# Altium footprint library Трансформаторы импульсные.PcbLib: 13 footprints
Each footprint in its own frame and in the unit in brackets; x right, y up, seen from the top. Pads: shape width x height; smd on the part's side, far side on the other; paste and mask are expansions set on the pad; w line width, h text height; cw(c..) or ccw(c..) is an arc to the next point about the centre after c.
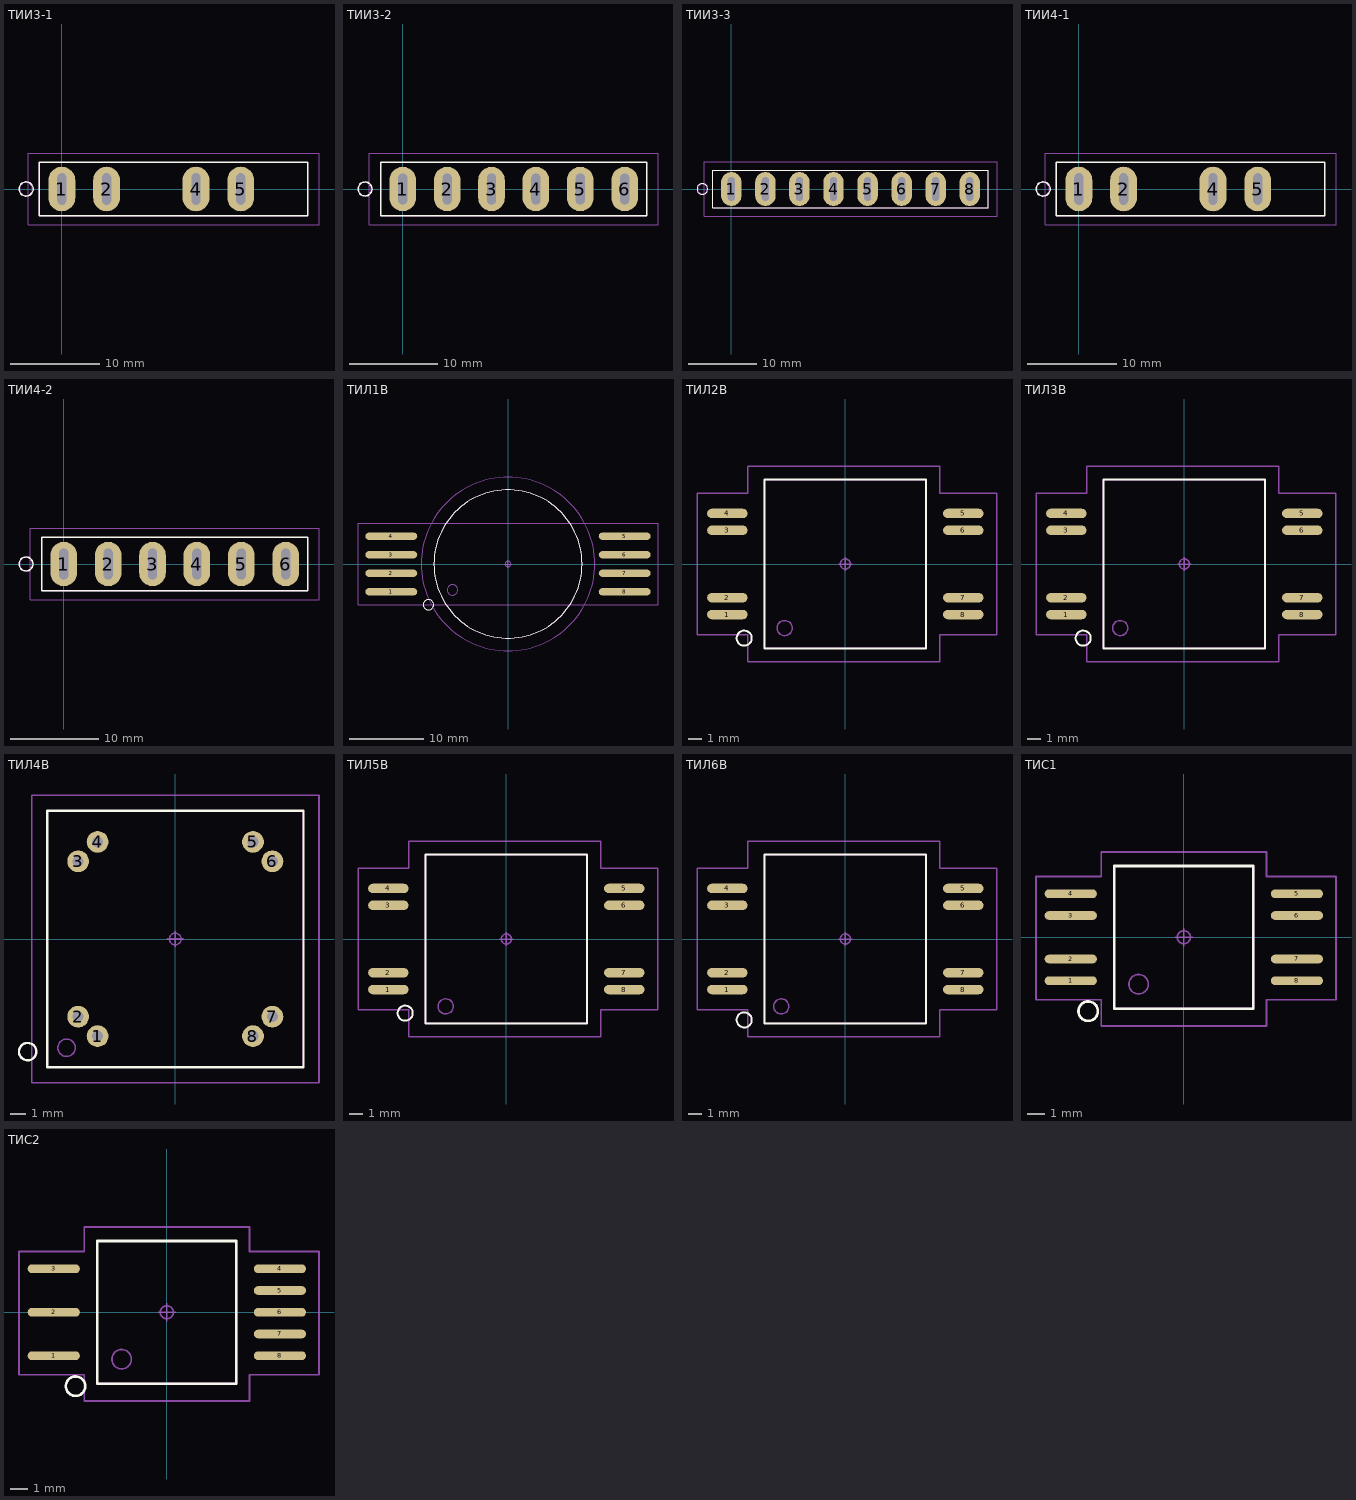
[diagram p0: the footprints below, top view; thin cyan lines are the x and y axes]

## ТИИ3-1 [mm] "30х6х20"
height 20
pads (4):
  oval 3x5 hole 3.5 slot 1 at 0 deg: 1(0,0) 2(5,0) 4(15,0) 5(20,0)
Top Overlay:
  circle w0.15: c-4,0 r0.791
  lines w0.15: -2.5,-3 -2.5,3 27.5,3 27.5,-3 -2.5,-3
Top Assembly (Mech13):
  circle w0.1: c-4,0 r0.707
  lines w0.1: -2.5,-3 -2.5,3 27.5,3 27.5,-3 -2.5,-3
Top Courtyard:
  lines w0.1: -3.75,-4 -3.75,-0.25 -3.75,4 28.75,4 28.75,-4 -3.75,-4
3D body "ТИИ3 (4 вывода).stp": height 20.05, standoff -7.15, extent -2.5,-3 27.5,3.01

## ТИИ3-2 [mm] "30х6х20"
height 20
pads (6):
  oval 3x5 hole 3.5 slot 1 at 0 deg: 1(0,0) 2(5,0) 3(10,0) 4(15,0) 5(20,0) 6(25,0)
Top Overlay:
  circle w0.15: c-4.25,0 r0.791
  lines w0.15: -2.5,-3 27.5,-3 27.5,3 -2.5,3 -2.5,-3
Top Assembly (Mech13):
  circle w0.1: c-4.25,0 r0.707
  lines w0.1: -2.5,-3 27.5,-3 27.5,3 -2.5,3 -2.5,-3
Top Courtyard:
  lines w0.1: -3.75,-4 28.75,-4 28.75,4 -3.75,4 -3.75,-0.25 -3.75,-4
3D body "ТИИ3 (6 выводов).stp": height 20.05, standoff -7.15, extent -2.5,-3 27.5,3.01

## ТИИ3-3 [mm] "40,5х5,5х20,5"
height 20.5
pads (8):
  oval 3x5 hole 3.5 slot 1 at 0 deg: 1(0,0) 2(5,0) 3(10,0) 4(15,0) 5(20,0) 6(25,0) 7(30,0) 8(35,0)
Top Overlay:
  circle w0.15: c-4.25,0 r0.791
  lines w0.15: -2.75,-2.75 -2.75,2.75 37.75,2.75 37.75,-2.75 -2.75,-2.75
Top Assembly (Mech13):
  circle w0.1: c-4.25,0 r0.707
  lines w0.1: -2.75,-2.75 -2.75,2.75 37.75,2.75 37.75,0 37.75,-2.75 -2.75,-2.75
Top Courtyard:
  lines w0.1: -4,-4 -4,0 -4,4 39,4 39,-4 -4,-4
3D body "ТИИ3 (8 выводов).stp": height 20.05, standoff -7.15, extent -2.5,-2.505 37.5,2.505

## ТИИ4-1 [mm] "30х6х20"
height 20
pads (4):
  oval 3x5 hole 3.5 slot 1 at 0 deg: 1(0,0) 2(5,0) 4(15,0) 5(20,0)
Top Overlay:
  circle w0.15: c-4,0 r0.791
  lines w0.15: -2.5,-3 -2.5,3 27.5,3 27.5,-3 -2.5,-3
Top Assembly (Mech13):
  circle w0.1: c-4,0 r0.707
  lines w0.1: -2.5,-3 -2.5,3 27.5,3 27.5,-3 -2.5,-3
Top Courtyard:
  lines w0.1: -3.75,-4 -3.75,-0.25 -3.75,4 28.75,4 28.75,-4 -3.75,-4
3D body "ТИИ4 (4 вывода).stp": height 20.05, standoff -7.15, extent -2.5,-3 27.5,3.01

## ТИИ4-2 [mm] "30х6х20"
height 20
pads (6):
  oval 3x5 hole 3.5 slot 1 at 0 deg: 1(0,0) 2(5,0) 3(10,0) 4(15,0) 5(20,0) 6(25,0)
Top Overlay:
  circle w0.15: c-4.25,0 r0.791
  lines w0.15: -2.5,-3 -2.5,3 27.5,3 27.5,-3 -2.5,-3
Top Assembly (Mech13):
  circle w0.1: c-4.25,0 r0.707
  lines w0.1: -2.5,-3 -2.5,3 27.5,3 27.5,-3 -2.5,-3
Top Courtyard:
  lines w0.1: -3.75,-4 -3.75,-0.25 -3.75,4 28.75,4 28.75,-4 -3.75,-4
3D body "ТИИ4 (6 выводов).stp": height 20.05, standoff -7.15, extent -2.5,-3 27.5,3.01

## ТИЛ1В [mm] "20х20х9, 5g"
height 9
pads (8):
  oval 7x1 smd: 1(-15.75,-3.75) 2(-15.75,-1.25) 3(-15.75,1.25) 4(-15.75,3.75) 5(15.75,3.75) 6(15.75,1.25) 7(15.75,-1.25) 8(15.75,-3.75)
Top Layer:
  lines w0.1: -15.75,-1.25 -15.25,-1.25 ; -15.75,1.25 -15.25,1.25 ; 15.25,-1.25 15.75,-1.25 ; 15.25,1.25 15.75,1.25
Top Overlay:
  circle w0.15: c0,0 r10
  circle w0.15: c-10.75,-5.5 r0.707
Top Assembly (Mech13):
  circle w0.1: c-7.5,-3.5 r0.707
  circle w0.1: c0,0 r10
Top Courtyard:
  circle w0.1: c0,0 r0.375
  circle w0.1: c0,0 r11.718
  lines w0.1: -10.75,5.5 20.25,5.5 20.25,-5.5 -20.25,-5.5 -20.25,5.5 -10.25,5.5 ; -0.5,0 0.5,0 ; 0,-0.5 0,0.5
3D body "ТИЛ1В.stp": height 9.21, standoff 0.2, extent -10,-10 10,10

## ТИЛ2В [mm] "12x12.5x6.5, 2g"
height 6.5
pads (8):
  oval 3x0.7 smd: 1(-8.75,-3.75) 2(-8.75,-2.5) 3(-8.75,2.5) 4(-8.75,3.75) 5(8.75,3.75) 6(8.75,2.5) 7(8.75,-2.5) 8(8.75,-3.75)
Top Overlay:
  circle w0.15: c-7.5,-5.5 r0.559
  lines w0.15: -6,-6.25 6,-6.25 6,6.25 -6,6.25 -6,-6.25
Top Assembly (Mech13):
  circle w0.1: c-4.5,-4.75 r0.559
  lines w0.1: -6,-6.25 6,-6.25 6,6.25 -6,6.25 -6,-6.25
Top Courtyard:
  circle w0.1: c0,0 r0.375
  lines w0.1: -0.5,0 0.5,0 ; 0,-0.5 0,0.5 ; -11,-5.25 -7.25,-5.25 -7.25,-7.25 7,-7.25 7,-5.25 11.25,-5.25 11.25,5.25 7,5.25 7,7.25 6,7.25 -7.25,7.25 -7.25,5.25 -11,5.25 -11,-5.25
3D body "ТИЛ2В.stp": height 6.71, standoff 0.2, extent -6,-6.25 6,6.25

## ТИЛ3В [mm] "12x12.5x6.5, 2g"
height 6.5
pads (8):
  oval 3x0.7 smd: 1(-8.75,-3.75) 2(-8.75,-2.5) 3(-8.75,2.5) 4(-8.75,3.75) 5(8.75,3.75) 6(8.75,2.5) 7(8.75,-2.5) 8(8.75,-3.75)
Top Overlay:
  circle w0.15: c-7.5,-5.5 r0.559
  lines w0.15: -6,-6.25 6,-6.25 6,6.25 -6,6.25 -6,-6.25
Top Assembly (Mech13):
  circle w0.1: c-4.75,-4.75 r0.559
  lines w0.1: -6,-6.25 6,-6.25 6,6.25 -6,6.25 -6,-6.25
Top Courtyard:
  circle w0.1: c0,0 r0.375
  lines w0.1: -0.5,0 0.5,0 ; 0,-0.5 0,0.5 ; -11,-5.25 -7.25,-5.25 -7.25,-7.25 7,-7.25 7,-5.25 11.25,-5.25 11.25,5.25 7,5.25 7,7.25 6,7.25 -7.25,7.25 -7.25,5.25 -11,5.25 -11,-5.25
3D body "ТИЛ3В.stp": height 6.51, standoff 0, extent -6,-6.25 6,6.25

## ТИЛ4В [mm] "16.5x16.5x9, 4g"
height 9
pads (8):
  round 1.4 hole 0.7: 1(-5,-6.25) 2(-6.25,-5) 3(-6.25,5) 4(-5,6.25) 5(5,6.25) 6(6.25,5) 7(6.25,-5) 8(5,-6.25)
Top Overlay:
  circle w0.15: c-9.5,-7.25 r0.559
  lines w0.15: -8.25,-8.25 -8.25,8.25 8.25,8.25 8.25,-8.25 -8.25,-8.25
Top Assembly (Mech13):
  circle w0.1: c-7,-7 r0.559
  lines w0.1: -8.25,-8.25 8.25,-8.25 8.25,8.25 -8.25,8.25 -8.25,-8.25
Top Courtyard:
  circle w0.1: c0,0 r0.375
  lines w0.1: -0.5,0 0.5,0 ; 0,-0.5 0,0.5 ; -9.25,-9.25 -9.25,9.25 9.25,9.25 9.25,-9.25 9,-9.25 -9.25,-9.25
3D body "ТИЛ4В.stp": height 9.01, standoff -3, extent -8.25,-8.25 8.25,8.25

## ТИЛ5В [mm] "12x12.5x6.5, 2g"
height 6.5
pads (8):
  oval 3x0.7 smd: 1(-8.75,-3.75) 2(-8.75,-2.5) 3(-8.75,2.5) 4(-8.75,3.75) 5(8.75,3.75) 6(8.75,2.5) 7(8.75,-2.5) 8(8.75,-3.75)
Top Overlay:
  circle w0.15: c-7.5,-5.5 r0.559
  lines w0.15: -6,-6.25 6,-6.25 6,6.25 -6,6.25 -6,-6.25
Top Assembly (Mech13):
  circle w0.1: c-4.5,-5 r0.559
  lines w0.1: -6,-6.25 6,-6.25 6,6.25 -6,6.25 -6,-6.25
Top Courtyard:
  circle w0.1: c0,0 r0.375
  lines w0.1: -0.5,0 0.5,0 ; 0,-0.5 0,0.5 ; -11,-5.25 -7.25,-5.25 -7.25,-7.25 7,-7.25 7,-5.25 11.25,-5.25 11.25,5.25 7,5.25 7,7.25 6,7.25 -7.25,7.25 -7.25,5.25 -11,5.25 -11,-5.25
3D body "ТИЛ5В.stp": height 6.71, standoff 0.2, extent -6,-6.25 6,6.25

## ТИЛ6В [mm] "12x12.5x6.5, 2g"
height 6.5
pads (8):
  oval 3x0.7 smd: 1(-8.75,-3.75) 2(-8.75,-2.5) 3(-8.75,2.5) 4(-8.75,3.75) 5(8.75,3.75) 6(8.75,2.5) 7(8.75,-2.5) 8(8.75,-3.75)
Top Overlay:
  circle w0.15: c-7.5,-6 r0.559
  lines w0.15: -6,-6.25 -6,6.25 6,6.25 6,-6.25 -6,-6.25
Top Assembly (Mech13):
  circle w0.1: c-4.75,-5 r0.559
  lines w0.1: -6,-6.25 -6,6.25 6,6.25 6,-6.25 -6,-6.25
Top Courtyard:
  circle w0.1: c0,0 r0.375
  lines w0.1: -0.5,0 0.5,0 ; 0,-0.5 0,0.5 ; -11,-5.25 -11,5.25 -7.25,5.25 -7.25,7.25 6,7.25 7,7.25 7,5.25 11.25,5.25 11.25,-5.25 7,-5.25 7,-7.25 -7.25,-7.25 -7.25,-5.25 -11,-5.25
3D body "ТИЛ6В.stp": height 6.71, standoff 0.2, extent -6,-6.25 6,6.25

## ТИС1 [mm] "8x8.2x5.8, 1g"
height 5.8
pads (8):
  oval 3x0.5 smd: 1(-6.5,-2.5) 2(-6.5,-1.25) 3(-6.5,1.25) 4(-6.5,2.5) 5(6.5,2.5) 6(6.5,1.25) 7(6.5,-1.25) 8(6.5,-2.5)
Top Overlay:
  circle w0.15: c-5.5,-4.25 r0.559
  lines w0.15: -4,-4.1 4,-4.1 4,4.1 -4,4.1 -4,-4.1
Top Assembly (Mech13):
  circle w0.1: c-2.6,-2.7 r0.559
  lines w0.1: -4,-4.1 4,-4.1 4,4.1 -4,4.1 -4,-4.1
Top Courtyard:
  circle w0.1: c0,0 r0.375
  lines w0.1: -0.5,0 0.5,0 ; 0,-0.5 0,0.5 ; -8.5,-3.6 -4.75,-3.6 -4.75,-5.1 4.75,-5.1 4.75,-3.6 8.75,-3.6 8.75,3.5 4.75,3.5 4.75,4.9 -4.75,4.9 -4.75,3.5 -8.5,3.5 -8.5,-3.6
3D body "ТИС1.stp": height 5.71, standoff 0.2, extent -3.75,-3.75 3.75,3.75

## ТИС2 [mm] "8x8.2x5.8, 1g"
height 5.8
pads (8):
  oval 3x0.5 smd: 1(-6.5,-2.5) 2(-6.5,0) 3(-6.5,2.5) 4(6.5,2.5) 5(6.5,1.25) 6(6.5,0) 7(6.5,-1.25) 8(6.5,-2.5)
Top Overlay:
  circle w0.15: c-5.25,-4.25 r0.559
  lines w0.15: -4,-4.1 4,-4.1 4,4.1 -4,4.1 -4,-4.1
Top Assembly (Mech13):
  circle w0.1: c-2.6,-2.7 r0.559
  lines w0.1: -4,-4.1 4,-4.1 4,4.1 -4,4.1 -4,-4.1
Top Courtyard:
  circle w0.1: c0,0 r0.375
  lines w0.1: -0.5,0 0.5,0 ; 0,-0.5 0,0.5 ; -8.5,-3.6 -4.75,-3.6 -4.75,-5.1 4.75,-5.1 4.75,-3.6 8.75,-3.6 8.75,3.5 4.75,3.5 4.75,4.9 -4.75,4.9 -4.75,3.5 -8.5,3.5 -8.5,-3.6
3D body "ТИС2.stp": height 5.71, standoff 0.2, extent -3.75,-3.75 3.75,3.75